# Altium footprint library th.PcbLib: 51 footprints (part 4 of 4)
Each footprint in its own frame and in the unit in brackets; x right, y up, seen from the top. Pads: shape width x height; smd on the part's side, far side on the other; paste and mask are expansions set on the pad; w line width, h text height; cw(c..) or ccw(c..) is an arc to the next point about the centre after c.
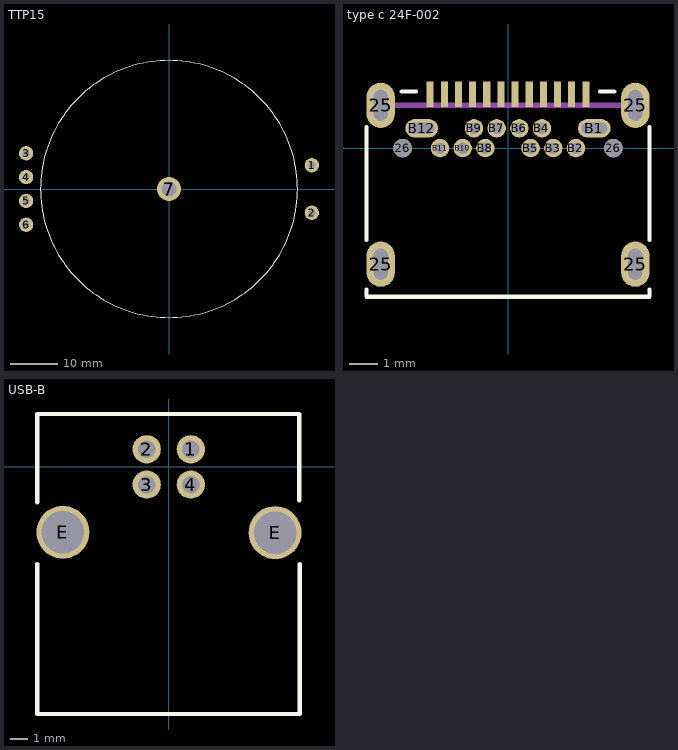
[diagram p3: the footprints below, top view; thin cyan lines are the x and y axes]

## TTP15 [mm]
pads (7):
  round 3 hole 1.5: 1(30,5) 2(30,-5) 3(-30,7.5) 4(-30,2.5) 5(-30,-2.5) 6(-30,-7.5)
  round 5 hole 3.2: 7(0,0)
Top Overlay:
  circle w0.254: c0,0 r27

## type c 24F-002 [mm]
pads (30):
  oval 1x1.6 hole 0.5 slot 1.1 at 90 deg mask+0.05: 25(-4.5,-4.1) 25(-4.5,1.51) 25(4.5,-4.1) 25(4.5,1.51)
  round 0.65 hole 0.65 mask+0.05: 26(-3.725,0) 26(3.725,0)
  rect 0.25x0.9 smd mask+0.05: A1(-2.75,1.91) A2(-2.25,1.91) A3(-1.75,1.91) A4(-1.25,1.91) A5(-0.75,1.91) A6(-0.25,1.91) A7(0.25,1.91) A8(0.75,1.91) A9(1.25,1.91) A10(1.75,1.91) A11(2.25,1.91) A12(2.75,1.91)
  oval 1.15x0.65 hole 0.4 slot 0.9 at 0 deg mask+0.05: B1(3.05,0.7) B12(-3.05,0.7)
  round 0.65 hole 0.4 mask+0.05: B2(2.4,0) B3(1.6,0) B4(1.2,0.7) B5(0.8,0) B6(0.4,0.7) B7(-0.4,0.7) B8(-0.8,0) B9(-1.2,0.7) B10(-1.6,0) B11(-2.4,0)
Top Overlay:
  lines w0.15: -5,-5 -5,-5.25 5,-5.25 5,-5 ; -5,-3.25 -5,0.75 ; -3.75,2 -3.25,2 ; 3.25,2 3.75,2 ; 5,-3.25 5,0.75
Mechanical 1:
  lines w0.2: -4.5,1.51 4.5,1.51
3D body "24pf-002.STEP": height 3.53, standoff -1.18, extent -4.925,-7.715 4.904,2.315

## USB-B [mm]
pads (6):
  round 1.6 hole 1: 1(1.25,1) 2(-1.25,1) 3(-1.25,-1) 4(1.25,-1)
  round 3 hole 2.4: E(-6,-3.7) E(6.025,-3.725)
Top Overlay:
  lines w0.254: -7.455,-5.5 -7.455,-14 7.425,-14 7.425,-5.5 ; -7.455,-2 -7.455,3 7.405,3 7.405,-1.9
3D body "670687041.stp": height 11, standoff -4.22, extent -7.455,-14 7.405,3